# Altium footprint library 集大电协1.5.PcbLib: 283 footprints (part 11 of 18)
Each footprint in its own frame and in the unit in brackets; x right, y up, seen from the top. Pads: shape width x height; smd on the part's side, far side on the other; paste and mask are expansions set on the pad; w line width, h text height; cw(c..) or ccw(c..) is an arc to the next point about the centre after c.
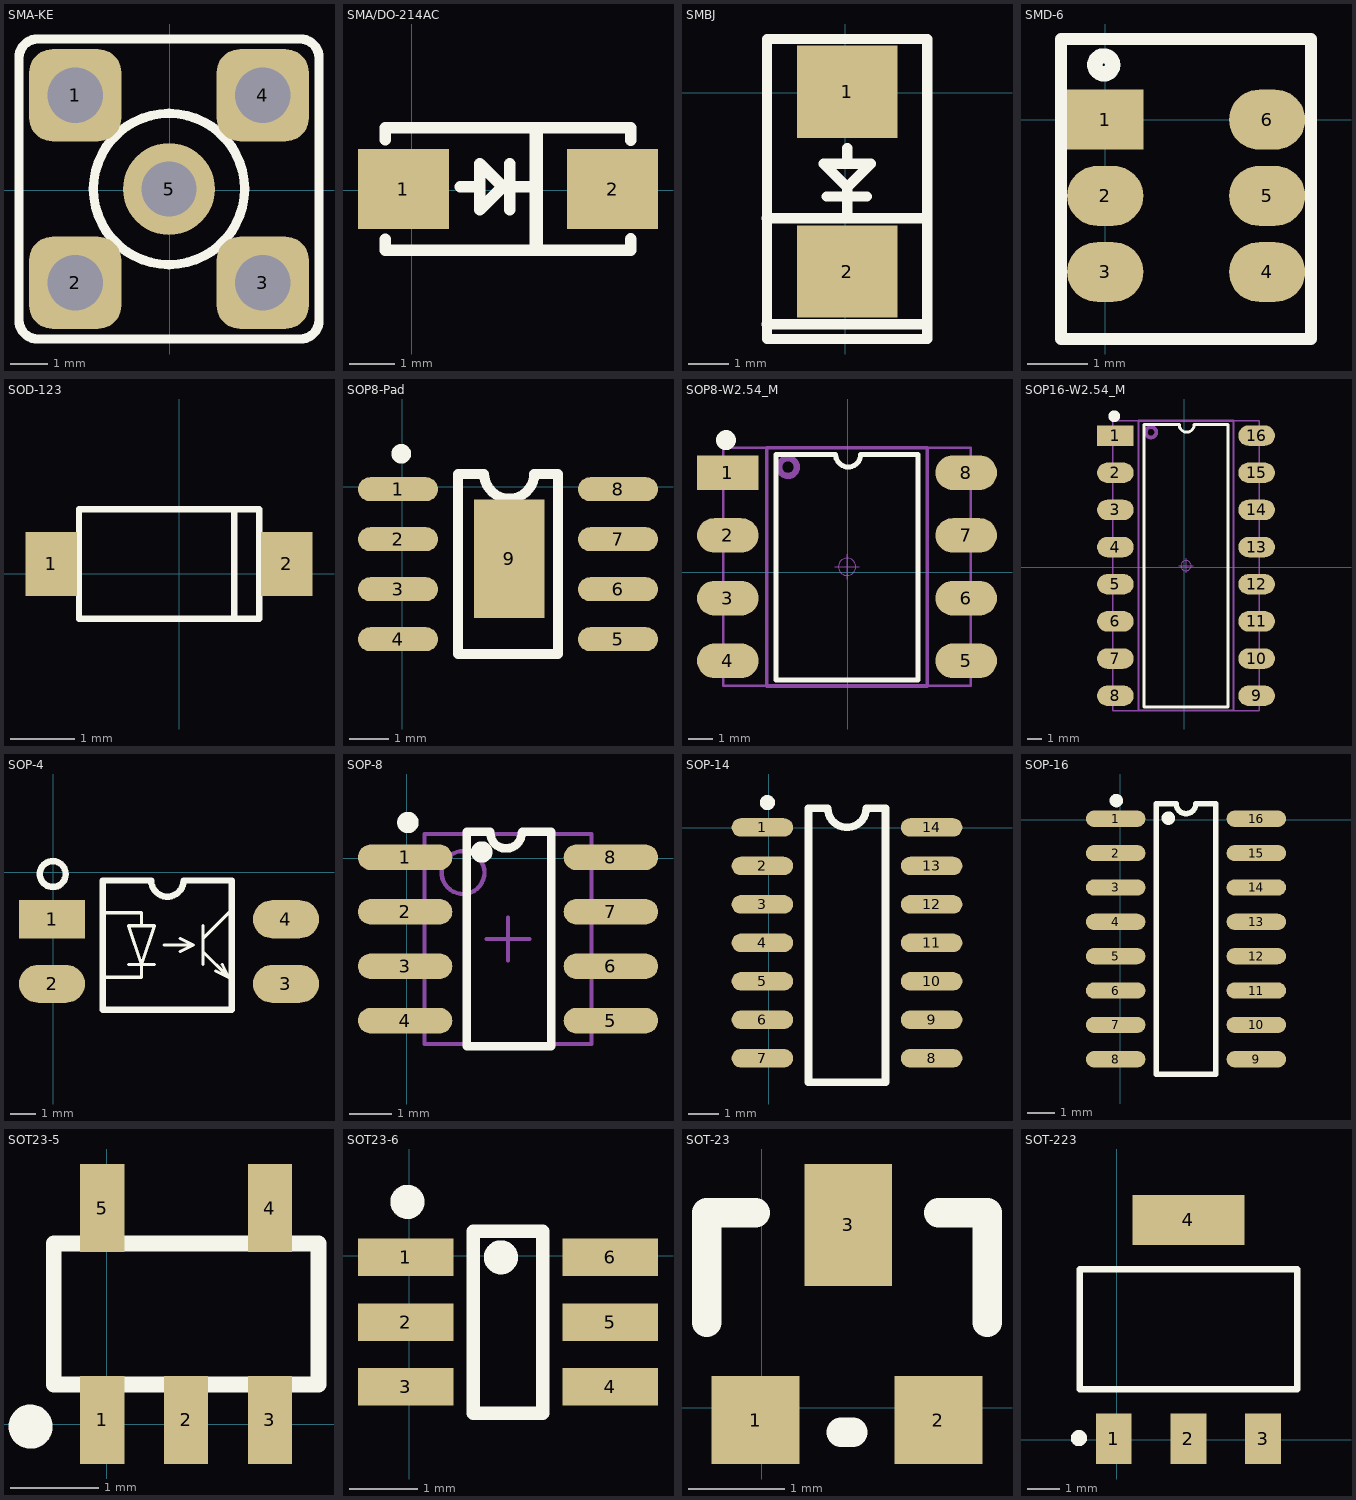
[diagram p10: the footprints below, top view; thin cyan lines are the x and y axes]

## SMA-KE [mm] "天线接头"
pads (5):
  rrect50% 2.5x2.5 hole 1.5: 1(-2.557,2.57) 2(-2.557,-2.51) 3(2.523,-2.51) 4(2.523,2.57)
  round 2.5 hole 1.5: 5(-0.017,0.03)
Top Overlay:
  circle w0.254: c-0.017,0.03 r2.048
  lines w0.2: 4.047,-3.526 4.047,-3.526 ; 4.047,-3.526 4.047,-3.526
  lines w0.254: 3.539,4.094 cw(c3.539,3.586) 4.047,3.586 4.047,-3.526 cw(c3.539,-3.526) 3.539,-4.034 -3.573,-4.034 cw(c-3.573,-3.526) -4.081,-3.526 -4.081,3.586 cw(c-3.573,3.586) -3.573,4.094 3.539,4.094 ; 3.539,4.094 3.539,4.094
3D body "User Library-SMA_Stehend_Amp 132134RP-1.STEP": height 9.53, standoff -3.94, extent -3.517,-3.47 3.483,3.53

## SMA/DO-214AC [mm]
pads (2):
  rect 2x1.75 smd: 1(-0.178,0.025) 2(4.422,0.025)
Top Overlay:
  lines w0.254: -0.578,-1.08 -0.578,-1.325 4.822,-1.325 4.822,-1.075 ; -0.578,1.105 -0.578,1.375 4.817,1.375 ; 1.067,0.076 1.397,0.076 ; 2.159,-0.432 2.159,0.584 ; 2.159,0.076 2.667,0.076 ; 4.822,1.1 4.822,1.375 ; 1.499,-0.432 1.499,0.584 2.007,0.076 1.499,-0.432
  lines w0.3: 2.742,-1.275 2.742,1.325
3D body "User Library-S1G.STEP": height 2.12, standoff -0.02, extent -0.376,-1.317 4.73,1.35

## SMBJ [mil] "TVS瞬态抑制二极管"
pads (2):
  rect 98x90 smd: 1(1.65,0.6) 2(1.65,-174.4)
Top Overlay:
  lines w10: -76.68,-225.78 79.32,-225.78 ; -76.68,-122.44 79.32,-122.44 ; -18.35,-101.4 20.65,-101.4 ; 1.65,-118.4 1.65,-93.4 ; 1.65,-69.4 1.65,-54.4 ; -76.35,-240.16 79.65,-240.16 79.65,52.17 -76.35,52.17 -76.35,-240.16 ; -21.35,-69.4 24.65,-69.4 1.65,-92.4 -21.35,-69.4
3D body "User Library-S1G.STEP": height 83.34, standoff -0.66, extent -49.88,-195.97 55.12,5.03

## SMD-6 [mm]
pads (6):
  rect 1.27x1 smd: 1(0,0)
  oval 1.27x1 smd: 2(0,-1.27) 3(0,-2.54) 4(2.7,-2.54) 5(2.7,-1.27) 6(2.7,0)
Top Overlay:
  circle w0.254: c-0.025,0.914 r0.15
  lines w0.2: -0.737,-3.658 -0.737,1.346 1.032,1.346 3.429,1.346 3.429,-3.658 -0.737,-3.658

## SOD-123 [mm]
pads (2):
  rect 0.8x1 smd: 1(-1.988,0.151) 2(1.67,0.151)
Top Overlay:
  lines w0.1: 0.857,-0.699 0.857,1.001 ; -1.556,-0.699 -1.556,1.001 1.244,1.001 1.244,-0.699 -1.556,-0.699
3D body "SOD-123_DiodesInc.STEP": height 1.43, standoff -0.02, extent -2.059,-0.738 1.791,0.962

## SOP8-Pad [mil]
pads (9):
  oval 80x24 smd: 1(-4.24,-2.45) 2(-4.24,-52.45) 3(-4.24,-102.45) 4(-4.24,-152.45) 5(215.76,-152.45) 6(215.76,-102.45) 7(215.76,-52.45) 8(215.76,-2.45)
  rect 70.87x118.11 smd: 9(107,-72)
Top Overlay:
  circle w9.84: c-1,33 r4.92
  lines w10: 55.76,-167 155.76,-167 155.76,13 132,13 cw(c107,13) 82,13 55.76,13 55.76,-167
3D body "SOP8.STEP": height 74.8, standoff 0.03, extent -11.22,-178.85 225.22,18

## SOP8-W2.54_M [mm]
pads (8):
  rect 2.5x1.4 smd: 1(-4.851,4.039)
  oval 2.5x1.4 smd: 2(-4.851,1.499) 3(-4.851,-1.041) 4(-4.851,-3.581) 5(4.801,-3.581) 6(4.801,-1.041) 7(4.801,1.499) 8(4.801,4.039)
Top Overlay:
  circle w0.5: c-4.93,5.359 r0.155
  lines w0.2: -2.896,4.781 -2.896,-4.363 2.845,-4.363 2.845,4.781
  lines w0.203: -2.896,4.781 -0.485,4.781 ccw(c0.023,4.781) 0.023,4.273 ccw(c0.023,4.781) 0.531,4.781 2.845,4.781
Mechanical 13:
  circle w0.254: c-2.417,4.267 r0.359
  lines w0.15: -3.275,-4.597 3.225,-4.597 3.225,5.055 -3.275,5.055 -3.275,-4.597
Mechanical 15:
  circle w0.05: c-0.025,0.229 r0.35
  lines w0.05: -0.525,0.229 0.475,0.229 ; -0.025,-0.271 -0.025,0.729
  lines w0.1: -5.029,-4.597 4.978,-4.597 4.978,5.055 -5.029,5.055 -5.029,-4.597
3D body "SOP8-W2.54.STEP": height 3.82, standoff -0.03, extent -5.025,-4.601 4.975,5.059

## SOP16-W2.54_M [mm]
pads (16):
  rect 2.5x1.4 smd: 1(-4.699,8.992)
  oval 2.5x1.4 smd: 2(-4.699,6.452) 3(-4.699,3.912) 4(-4.699,1.372) 5(-4.699,-1.168) 6(-4.699,-3.708) 7(-4.699,-6.248) 8(-4.699,-8.788) 9(4.953,-8.788) 10(4.953,-6.248) 11(4.953,-3.708) 12(4.953,-1.168) 13(4.953,1.372) 14(4.953,3.912) 15(4.953,6.452) 16(4.953,8.992)
Top Overlay:
  circle w0.5: c-4.777,10.312 r0.155
  lines w0.2: -2.743,-9.57 2.997,-9.57 2.997,9.734 ; -2.743,-9.55 -2.743,9.734
  lines w0.203: -2.743,9.734 -0.333,9.734 ccw(c0.175,9.734) 0.175,9.226 ccw(c0.175,9.734) 0.683,9.734 2.997,9.734
Mechanical 13:
  circle w0.254: c-2.264,9.22 r0.359
  lines w0.15: -3.123,-9.804 3.377,-9.804 3.377,10.008 -3.123,10.008 -3.123,-9.804
Mechanical 15:
  circle w0.05: c0.127,0.102 r0.35
  lines w0.05: -0.373,0.102 0.627,0.102 ; 0.127,-0.398 0.127,0.602
  lines w0.1: -4.877,-9.804 5.131,-9.804 5.131,10.008 -4.877,10.008 -4.877,-9.804
3D body "SOP16-W2.54.STEP": height 3.82, standoff -0.03, extent -4.873,-9.808 5.127,10.012

## SOP-4 [mm]
pads (4):
  rect 2.6x1.5 smd: 1(-0.05,-1.846)
  oval 2.6x1.5 smd: 2(-0.05,-4.386) 3(9.15,-4.386) 4(9.15,-1.846)
Top Overlay:
  circle w0.254: c-0.022,-0.068 r0.508
  lines w0.127: 1.946,-4.132 3.47,-4.132 3.47,-3.624 ; 1.946,-1.592 3.47,-1.592 3.47,-2.1 ; 2.962,-3.624 3.978,-3.624 ; 4.359,-2.862 5.502,-2.862 ; 4.994,-3.116 5.502,-2.862 ; 4.994,-2.608 5.502,-2.862 ; 5.883,-3.624 5.883,-2.1 ; 5.883,-3.116 6.899,-4.132 ; 5.883,-2.608 6.899,-1.592 ; 6.391,-3.878 6.899,-4.132 ; 6.645,-3.624 6.899,-4.132 ; 3.47,-3.624 3.978,-2.1 2.962,-2.1 3.47,-3.624
  lines w0.254: 1.946,-5.402 7.026,-5.402 7.026,-0.322 5.121,-0.322 cw(c4.486,-0.322) 3.851,-0.322 1.946,-0.322 1.946,-5.402
3D body "User Library-SOP254P665X290.STEP": height 2.9, standoff 0, extent 1.164,-5.4 7.85,-0.45

## SOP-8 [mm]
pads (8):
  oval 2.2x0.6 smd: 1(-0.038,0.025) 2(-0.038,-1.245) 3(-0.038,-2.515) 4(-0.038,-3.785) 5(4.762,-3.785) 6(4.762,-2.515) 7(4.762,-1.245) 8(4.762,0.025)
Top Overlay:
  circle w0.25: c1.75,0.15 r0.125
  circle w0.25: c0.025,0.838 r0.125
  lines w0.2: 1.95,0.6 ccw(c2.317,0.6) 2.683,0.6 ; 1.95,0.62 1.4,0.62 1.4,-4.38 3.375,-4.38 3.375,0.62 2.7,0.62
Mechanical 13:
  circle w0.1: c1.312,-0.33 r0.5
  lines w0.1: 0.412,-4.33 0.412,0.57 4.312,0.57 4.312,-4.33 0.412,-4.33
Mechanical 15:
  lines w0.1: 1.862,-1.88 2.862,-1.88 ; 2.362,-2.38 2.362,-1.38
3D body "SOP-8.STEP": height 1.7, standoff 0, extent -0.625,-4.325 5.375,0.575

## SOP-14 [mil]
pads (14):
  oval 80x24 smd: 1(-8.54,0.68) 2(-8.54,-49.32) 3(-8.54,-99.32) 4(-8.54,-149.32) 5(-8.54,-199.32) 6(-8.54,-249.32) 7(-8.54,-299.32) 8(211.46,-299.32) 9(211.46,-249.32) 10(211.46,-199.32) 11(211.46,-149.32) 12(211.46,-99.32) 13(211.46,-49.32) 14(211.46,0.68)
Top Overlay:
  circle w9.84: c-2,33 r4.92
  lines w10: 51.46,-330.71 51.46,25.68 76.46,25.68 ccw(c101.46,25.68) 126.46,25.68 151.46,25.68 151.46,-330.71 51.46,-330.71
3D body "User Library-SOP14-p127-780.STEP": height 43.31, standoff 0, extent -43.31,-349.41 244.09,52.16

## SOP-16 [mm]
pads (16):
  oval 2.2x0.6 smd: 1(-0.174,0.028) 2(-0.174,-1.242) 3(-0.174,-2.512) 4(-0.174,-3.782) 5(-0.174,-5.052) 6(-0.174,-6.322) 7(-0.174,-7.592) 8(-0.174,-8.862) 9(5.026,-8.862) 10(5.026,-7.592) 11(5.026,-6.322) 12(5.026,-5.052) 13(5.026,-3.782) 14(5.026,-2.512) 15(5.026,-1.242) 16(5.026,0.028)
Top Overlay:
  circle w0.25: c1.775,0.05 r0.125
  circle w0.25: c-0.15,0.7 r0.125
  lines w0.2: 1.326,-9.417 1.326,0.583 2.059,0.583 ccw(c2.426,0.583) 2.793,0.583 3.526,0.583 3.526,-9.417 1.326,-9.417
3D body "SOP-16.STEP": height 1.4, standoff 0, extent -0.45,-9.4 5.55,0.5

## SOT23-5 [mm]
pads (5):
  rect 0.5x1 smd: 1(-0.051,0.051) 2(0.899,0.051) 3(1.849,0.051) 4(1.849,2.451) 5(-0.051,2.451)
Top Overlay:
  circle w0.25: c-0.864,-0.025 r0.125
  lines w0.178: -0.601,0.451 2.399,0.451 2.399,2.051 -0.601,2.051 -0.601,0.451
3D body "User Library-SOT23-5.STEP": height 1.09, standoff -0.01, extent -0.551,-0.15 2.349,2.65

## SOT23-6 [mm]
pads (6):
  rect 1.4x0.55 smd: 1(-0.051,-0.025) 2(-0.051,-0.975) 3(-0.051,-1.925) 4(2.949,-1.925) 5(2.949,-0.975) 6(2.949,-0.025)
Top Overlay:
  circle w0.25: c1.346,-0.025 r0.125
  circle w0.25: c-0.025,0.787 r0.125
  lines w0.2: 0.941,-2.311 1.957,-2.311 1.957,0.356 0.941,0.356 0.941,-2.311
3D body "SOT23-6.STEP": height 1.15, standoff -0.03, extent 0.07,-2.467 2.877,0.533

## SOT-23 [mil]
pads (3):
  rect 36x36 smd: 1(-2.52,-5.16) 2(72.48,-5.16)
  rect 36x50 smd: 3(35.48,74.84)
Top Overlay:
  lines w12: -22.52,34.84 -22.52,79.84 -2.52,79.84 ; 32.48,-10.16 37.48,-10.16 ; 72.48,79.84 92.48,79.84 92.48,34.84
3D body "SOT-23-3.STEP": height 47.24, standoff 0, extent -22.08,-18.11 92.09,92.12

## SOT-223 [mm]
pads (4):
  rect 1.1x1.55 smd: 1(-0.09,0.029) 2(2.21,0.029) 3(4.51,0.029)
  rect 3.45x1.55 smd: 4(2.21,6.779)
Top Overlay:
  circle w0.25: c-1.166,0.051 r0.125
  lines w0.2: -1.14,1.554 -1.14,5.254 5.56,5.254 5.56,1.554 -1.14,1.554
3D body: height 0.8, standoff 0, extent -1.092,1.372 5.512,5.563
3D body: height 0.3, standoff 0, extent 0.559,5.563 3.861,6.833
3D body: height 0.3, standoff 0, extent -0.584,-0.533 0.305,1.372
3D body: height 0.3, standoff 0, extent 1.702,-0.533 2.591,1.372
3D body: height 0.3, standoff 0, extent 4.115,-0.533 5.004,1.372